# Altium footprint library 镙丝套件.PcbLib: 33 footprints (part 2 of 3)
Each footprint in its own frame and in the unit in brackets; x right, y up, seen from the top. Pads: shape width x height; smd on the part's side, far side on the other; paste and mask are expansions set on the pad; w line width, h text height; cw(c..) or ccw(c..) is an arc to the next point about the centre after c.
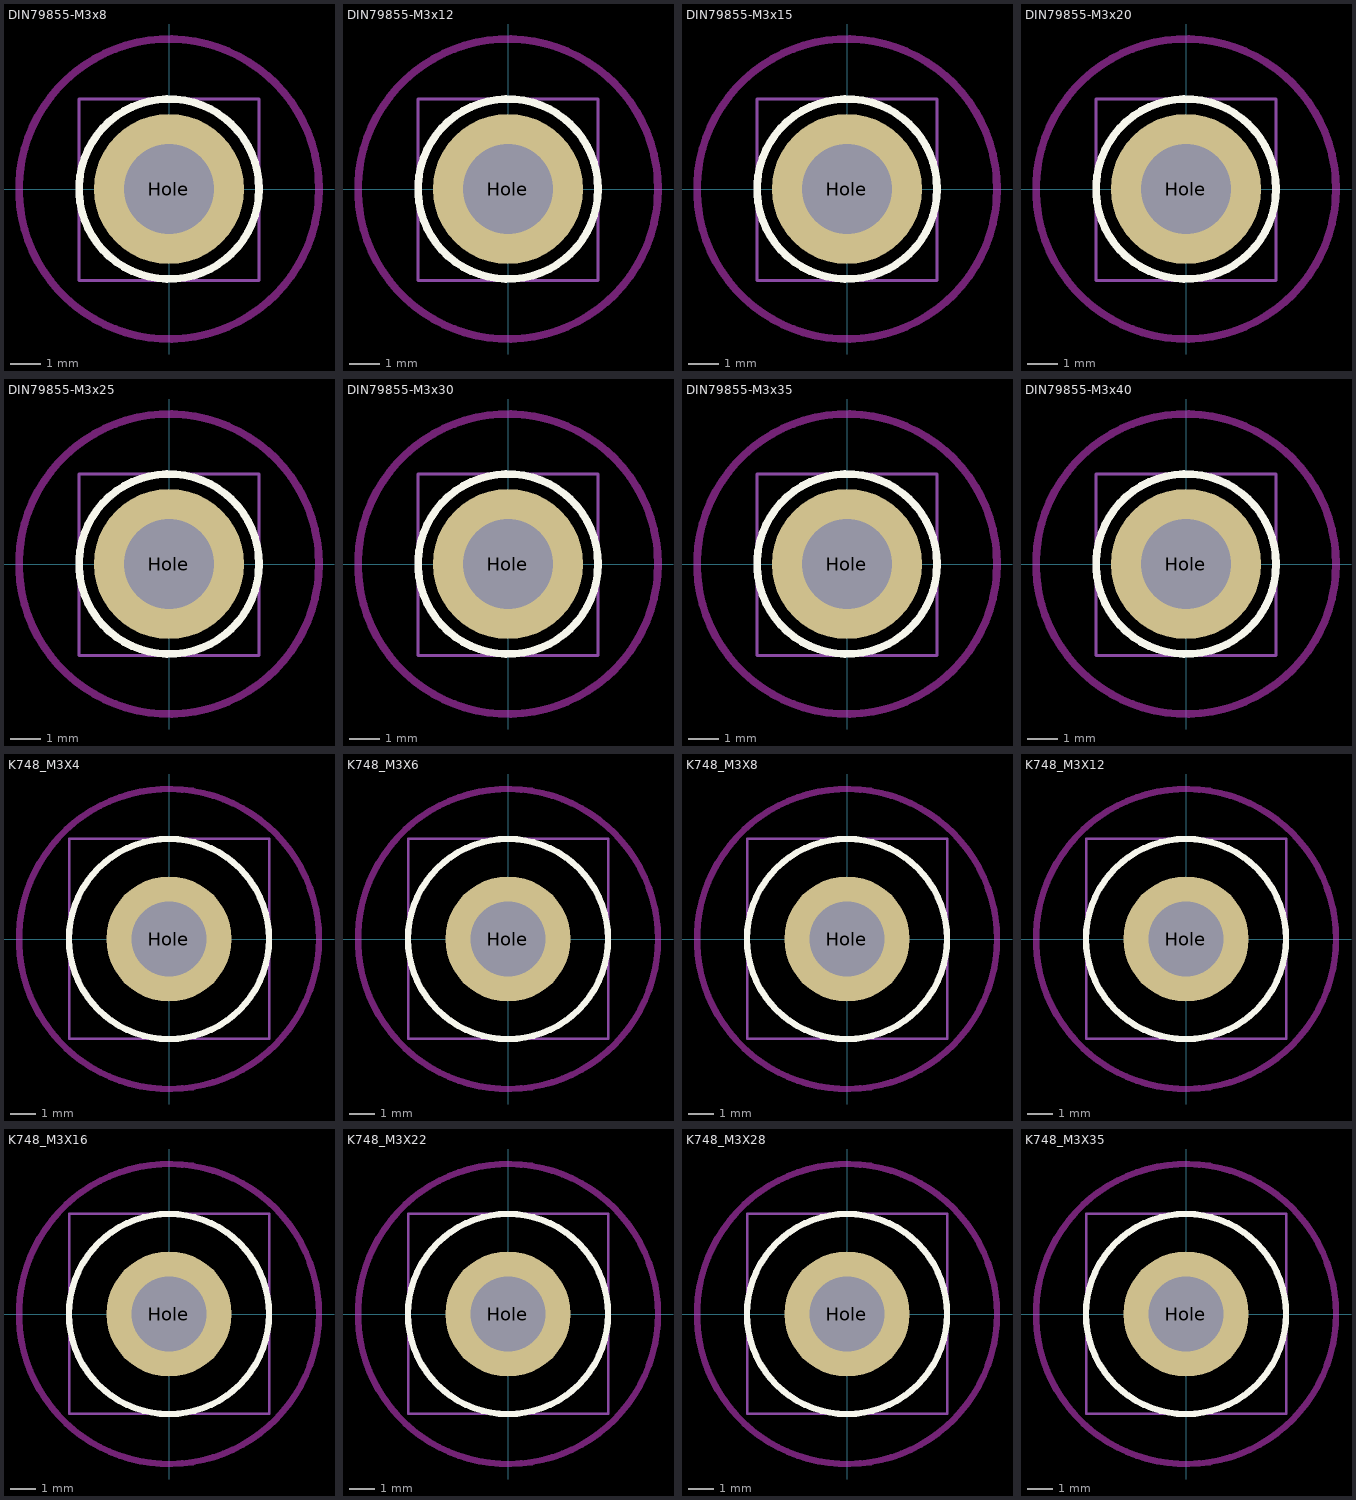
[diagram p1: the footprints below, top view; thin cyan lines are the x and y axes]

## DIN79855-M3x8 [mm] "半圆头M3x8mm镙丝"
height 2
pads (1):
  round 5 hole 3: Hole(0,0)
Top Overlay:
  circle w0.254: c0,0 r3
Keep-Out Layer:
  circle w0.254: c0,0 r5
Mechanical 1:
  circle w0.15: c0,0 r1.5
Mechanical 13:
  lines w0.1: -3,-3.048 3,-3.048 3,3 -3,3 -3,-3.048
Mechanical 15:
  lines w0.1: -1,0 1,0 ; 0,-1 0,1
3D body: height 3.47, standoff -7, extent -3,-3 3,3

## DIN79855-M3x12 [mm] "半圆头M3x12mm镙丝"
height 2
pads (1):
  round 5 hole 3: Hole(0,0)
Top Overlay:
  circle w0.254: c0,0 r3
Keep-Out Layer:
  circle w0.254: c0,0 r5
Mechanical 1:
  circle w0.15: c0,0 r1.5
Mechanical 13:
  lines w0.1: -3,-3.048 3,-3.048 3,3 -3,3 -3,-3.048
Mechanical 15:
  lines w0.1: -1,0 1,0 ; 0,-1 0,1
3D body: height 3.47, standoff -11, extent -3,-3 3,3

## DIN79855-M3x15 [mm] "半圆头M3x15mm镙丝"
height 2
pads (1):
  round 5 hole 3: Hole(0,0)
Top Overlay:
  circle w0.254: c0,0 r3
Keep-Out Layer:
  circle w0.254: c0,0 r5
Mechanical 1:
  circle w0.15: c0,0 r1.5
Mechanical 13:
  lines w0.1: -3,-3.048 -3,3 3,3 3,-3.048 -3,-3.048
Mechanical 15:
  lines w0.1: -1,0 1,0 ; 0,-1 0,1
3D body: height 3.47, standoff -14, extent -3,-3 3,3

## DIN79855-M3x20 [mm] "半圆头M3x20mm镙丝"
height 2
pads (1):
  round 5 hole 3: Hole(0,0)
Top Overlay:
  circle w0.254: c0,0 r3
Keep-Out Layer:
  circle w0.254: c0,0 r5
Mechanical 1:
  circle w0.15: c0,0 r1.5
Mechanical 13:
  lines w0.1: -3,-3.048 3,-3.048 3,3 -3,3 -3,-3.048
Mechanical 15:
  lines w0.1: -1,0 1,0 ; 0,-1 0,1
3D body: height 3.47, standoff -19, extent -3,-3 3,3

## DIN79855-M3x25 [mm] "半圆头M3x25mm镙丝"
height 2
pads (1):
  round 5 hole 3: Hole(0,0)
Top Overlay:
  circle w0.254: c0,0 r3
Keep-Out Layer:
  circle w0.254: c0,0 r5
Mechanical 1:
  circle w0.15: c0,0 r1.5
Mechanical 13:
  lines w0.1: -3,-3.048 3,-3.048 3,3 -3,3 -3,-3.048
Mechanical 15:
  lines w0.1: -1,0 1,0 ; 0,-1 0,1
3D body: height 3.47, standoff -24, extent -3,-3 3,3

## DIN79855-M3x30 [mm] "半圆头M3x30mm镙丝"
height 2
pads (1):
  round 5 hole 3: Hole(0,0)
Top Overlay:
  circle w0.254: c0,0 r3
Keep-Out Layer:
  circle w0.254: c0,0 r5
Mechanical 1:
  circle w0.15: c0,0 r1.5
Mechanical 13:
  lines w0.1: -3,-3.048 -3,3 3,3 3,-3.048 -3,-3.048
Mechanical 15:
  lines w0.1: -1,0 1,0 ; 0,-1 0,1
3D body: height 3.47, standoff -29, extent -3,-3 3,3

## DIN79855-M3x35 [mm] "半圆头M3x35mm镙丝"
height 2
pads (1):
  round 5 hole 3: Hole(0,0)
Top Overlay:
  circle w0.254: c0,0 r3
Keep-Out Layer:
  circle w0.254: c0,0 r5
Mechanical 1:
  circle w0.15: c0,0 r1.5
Mechanical 13:
  lines w0.1: -3,-3.048 3,-3.048 3,3 -3,3 -3,-3.048
Mechanical 15:
  lines w0.1: -1,0 1,0 ; 0,-1 0,1
3D body: height 3.47, standoff -34, extent -3,-3 3,3

## DIN79855-M3x40 [mm] "半圆头M3x40mm镙丝"
height 2
pads (1):
  round 5 hole 3: Hole(0,0)
Top Overlay:
  circle w0.254: c0,0 r3
Keep-Out Layer:
  circle w0.254: c0,0 r5
Mechanical 1:
  circle w0.15: c0,0 r1.5
Mechanical 13:
  lines w0.1: -3,-3.048 3,-3.048 3,3 -3,3 -3,-3.048
Mechanical 15:
  lines w0.1: -1,0 1,0 ; 0,-1 0,1
3D body: height 3.47, standoff -39, extent -3,-3 3,3

## K748_M3X4 [mm] "大帽头M3x4mm镙丝"
height 2
pads (1):
  round 5 hole 3: Hole(0,0)
Top Overlay:
  circle w0.254: c0,0 r4
Keep-Out Layer:
  circle w0.254: c0,0 r6
Mechanical 1:
  circle w0.15: c0,0 r1.5
Mechanical 13:
  lines w0.1: -4,-4 4,-4 4,4 -4,4 -4,-4
Mechanical 15:
  lines w0.1: -1,0 1,0 ; 0,-1 0,1
3D body: height 3.5, standoff -3, extent -4,-4 4,4

## K748_M3X6 [mm] "大帽头M3x6mm镙丝"
height 2
pads (1):
  round 5 hole 3: Hole(0,0)
Top Overlay:
  circle w0.254: c0,0 r4
Keep-Out Layer:
  circle w0.254: c0,0 r6
Mechanical 1:
  circle w0.15: c0,0 r1.5
Mechanical 13:
  lines w0.1: -4,-4 -4,4 4,4 4,-4 -4,-4
Mechanical 15:
  lines w0.1: -1,0 1,0 ; 0,-1 0,1
3D body: height 3.5, standoff -5, extent -4,-4 4,4

## K748_M3X8 [mm] "大帽头M3x8mm镙丝"
height 2
pads (1):
  round 5 hole 3: Hole(0,0)
Top Overlay:
  circle w0.254: c0,0 r4
Keep-Out Layer:
  circle w0.254: c0,0 r6
Mechanical 1:
  circle w0.15: c0,0 r1.5
Mechanical 13:
  lines w0.1: -4,-4 4,-4 4,4 -4,4 -4,-4
Mechanical 15:
  lines w0.1: -1,0 1,0 ; 0,-1 0,1
3D body: height 3.5, standoff -5, extent -4,-4 4,4

## K748_M3X12 [mm] "大帽头M3x12mm镙丝"
height 2
pads (1):
  round 5 hole 3: Hole(0,0)
Top Overlay:
  circle w0.254: c0,0 r4
Keep-Out Layer:
  circle w0.254: c0,0 r6
Mechanical 1:
  circle w0.15: c0,0 r1.5
Mechanical 13:
  lines w0.1: -4,-4 4,-4 4,4 -4,4 -4,-4
Mechanical 15:
  lines w0.1: -1,0 1,0 ; 0,-1 0,1
3D body: height 7.5, standoff -5, extent -4,-4 4,4

## K748_M3X16 [mm] "大帽头M3x16mm镙丝"
height 2
pads (1):
  round 5 hole 3: Hole(0,0)
Top Overlay:
  circle w0.254: c0,0 r4
Keep-Out Layer:
  circle w0.254: c0,0 r6
Mechanical 1:
  circle w0.15: c0,0 r1.5
Mechanical 13:
  lines w0.1: -4,-4 4,-4 4,4 -4,4 -4,-4
Mechanical 15:
  lines w0.1: -1,0 1,0 ; 0,-1 0,1
3D body: height 11.5, standoff -5, extent -4,-4 4,4

## K748_M3X22 [mm] "大帽头M3x22mm镙丝"
height 2
pads (1):
  round 5 hole 3: Hole(0,0)
Top Overlay:
  circle w0.254: c0,0 r4
Keep-Out Layer:
  circle w0.254: c0,0 r6
Mechanical 1:
  circle w0.15: c0,0 r1.5
Mechanical 13:
  lines w0.1: -4,-4 4,-4 4,4 -4,4 -4,-4
Mechanical 15:
  lines w0.1: -1,0 1,0 ; 0,-1 0,1
3D body: height 17.5, standoff -5, extent -4,-4 4,4

## K748_M3X28 [mm] "大帽头M3x28mm镙丝"
height 2
pads (1):
  round 5 hole 3: Hole(0,0)
Top Overlay:
  circle w0.254: c0,0 r4
Keep-Out Layer:
  circle w0.254: c0,0 r6
Mechanical 1:
  circle w0.15: c0,0 r1.5
Mechanical 13:
  lines w0.1: -4,-4 4,-4 4,4 -4,4 -4,-4
Mechanical 15:
  lines w0.1: -1,0 1,0 ; 0,-1 0,1
3D body: height 23.5, standoff -5, extent -4,-4 4,4

## K748_M3X35 [mm] "大帽头M3x35mm镙丝"
height 2
pads (1):
  round 5 hole 3: Hole(0,0)
Top Overlay:
  circle w0.254: c0,0 r4
Keep-Out Layer:
  circle w0.254: c0,0 r6
Mechanical 1:
  circle w0.15: c0,0 r1.5
Mechanical 13:
  lines w0.1: -4,-4 4,-4 4,4 -4,4 -4,-4
Mechanical 15:
  lines w0.1: -1,0 1,0 ; 0,-1 0,1
3D body: height 30.5, standoff -5, extent -4,-4 4,4